# Altium footprint library XC Driver Board.PcbLib: 29 footprints (part 1 of 2)
Each footprint in its own frame and in the unit in brackets; x right, y up, seen from the top. Pads: shape width x height; smd on the part's side, far side on the other; paste and mask are expansions set on the pad; w line width, h text height; cw(c..) or ccw(c..) is an arc to the next point about the centre after c.
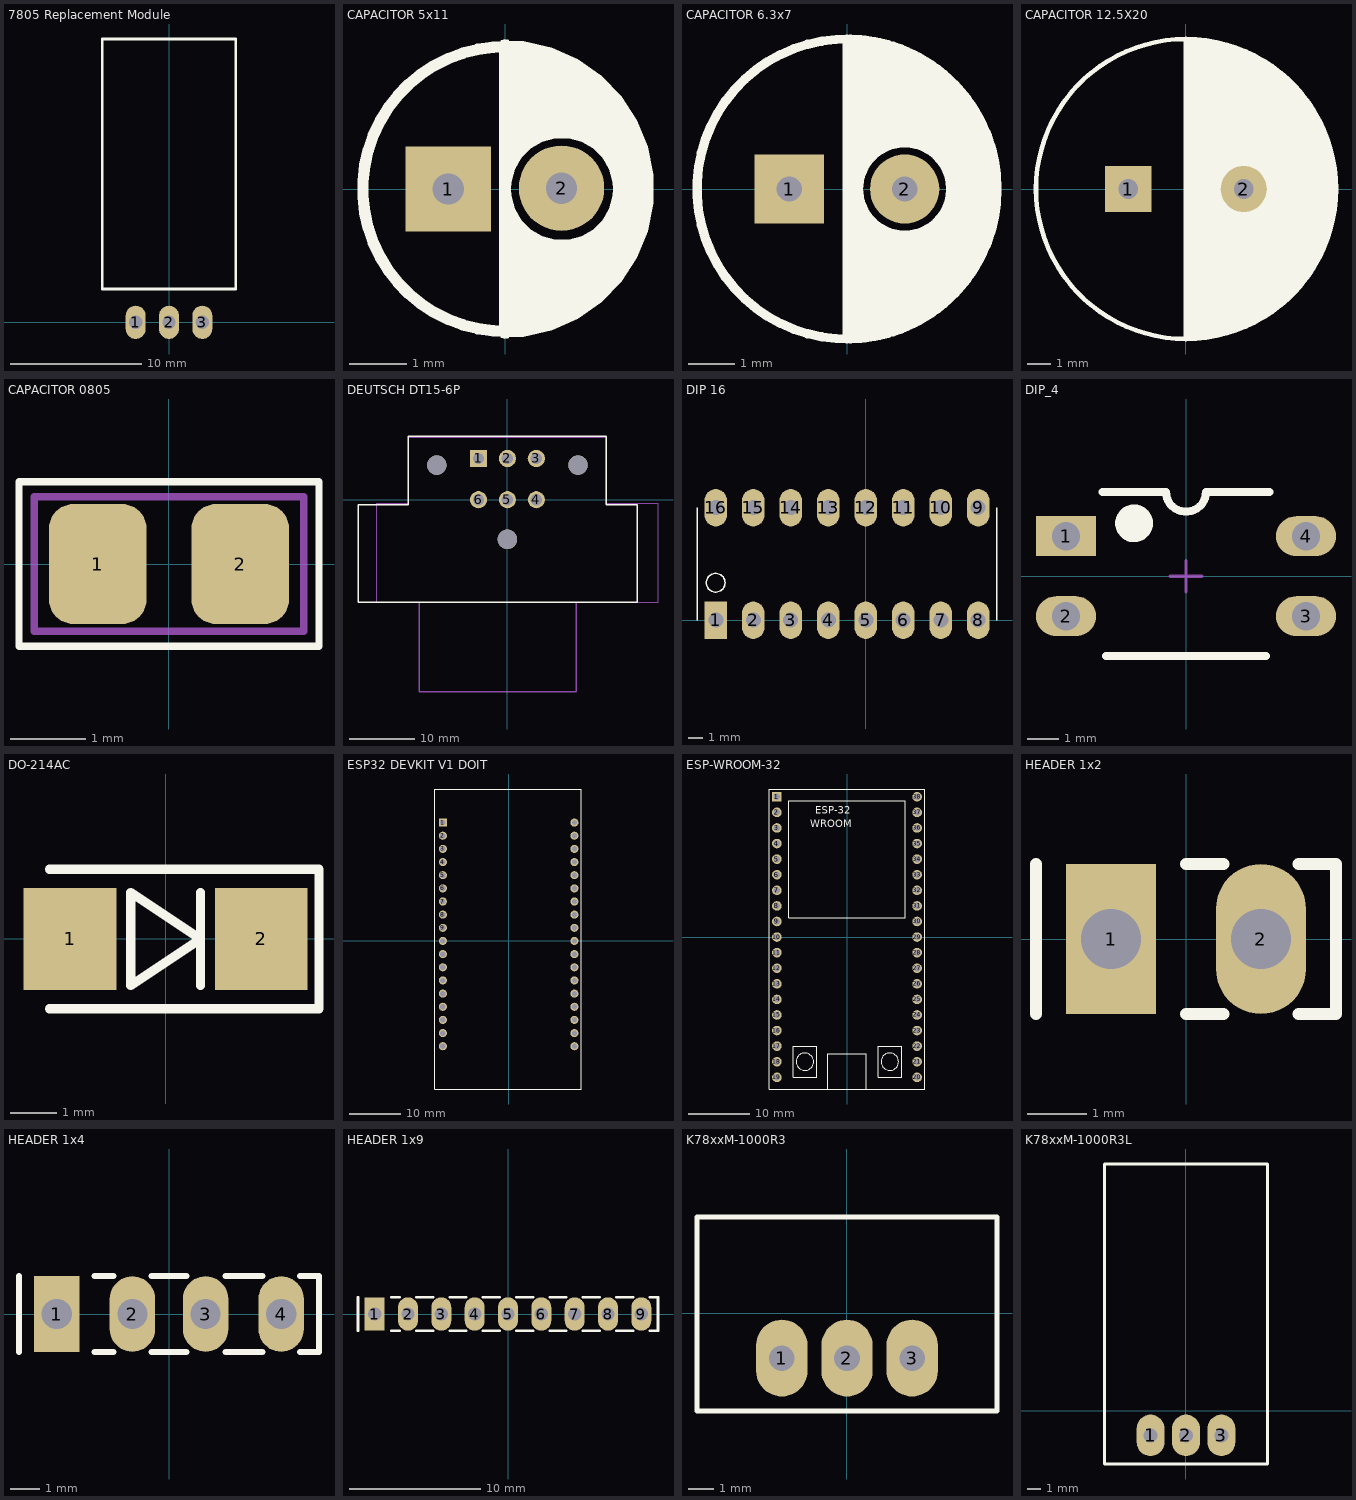
[diagram p0: the footprints below, top view; thin cyan lines are the x and y axes]

## 7805 Replacement Module [mil]
pads (3):
  oval 60x100 hole 40: 1(-100,0) 2(0,0) 3(100,0)
Top Overlay:
  lines w7.87: -200,100 200,100 200,850 -200,850 -200,100
3D body "DD4012SA 6.5-40V to 3.3V 5V DC-DC Step-Down Buck Converter, 1A.STEP": height 291.84, standoff 0.5, extent -204.72,-90.55 204.73,854.33

## CAPACITOR 5x11 [mm] "CAPACITOR ALUMINIUM ELECTROLYTIC D=5MM H=11"
pads (2):
  rect 1.5x1.5 hole 0.55: 1(-1,0)
  round 1.5 hole 0.55: 2(0.99,0.015)
Top Overlay:
  circle w0.2: c0,0 r2.5
  region: -0.1,0 -0.1,2.53 -0.1,2.561 -0.066,2.612 -0.009,2.635 0.051,2.622 0.072,2.599 0.324,2.592 0.815,2.482 1.275,2.28 1.689,1.993 2.04,1.633 2.315,1.211 2.504,0.745 2.6,0.252 2.6,0 2.6,-0.02 2.585,-0.057 2.557,-0.085 2.52,-0.1 2.5,-0.1 2,-0.1 1.98,-0.1 1.943,-0.085 1.915,-0.057 1.9,-0.02 1.9,0 1.892,0.117 1.831,0.344 1.714,0.548 1.548,0.714 1.344,0.831 1.117,0.892 0.883,0.892 0.656,0.831 0.452,0.714 0.286,0.548 0.169,0.344 0.108,0.117 0.1,0 0.1,-0.042 0.042,-0.1 -0.042,-0.1 -0.1,-0.042
  region: -0.1,0 -0.1,-2.53 -0.1,-2.561 -0.066,-2.612 -0.009,-2.635 0.051,-2.622 0.072,-2.599 0.324,-2.592 0.815,-2.482 1.275,-2.28 1.689,-1.993 2.04,-1.633 2.315,-1.211 2.504,-0.745 2.6,-0.252 2.6,0 2.6,0.02 2.585,0.057 2.557,0.085 2.52,0.1 2.5,0.1 2,0.1 1.98,0.1 1.943,0.085 1.915,0.057 1.9,0.02 1.9,0 1.892,-0.117 1.831,-0.344 1.714,-0.548 1.548,-0.714 1.344,-0.831 1.117,-0.892 0.883,-0.892 0.656,-0.831 0.452,-0.714 0.286,-0.548 0.169,-0.344 0.108,-0.117 0.1,0 0.1,0.042 0.042,0.1 -0.042,0.1 -0.1,0.042
  lines w0.2: 0,-2.5 ccw(c0,0) 2.5,0 ; 0,2.5 cw(c0,0) 2.5,0 ; 0,2.53 0,0 ; 0,0 cw(c1,0) 2,0 ; 0,0 ccw(c1,0) 2,0 ; 2,0 2.5,0 ; 2,0 2.5,0
3D body "Capacitor_Electrolytic_5mm.stp": height 8.3, standoff -2.4, extent -2.5,-2.5 2.53,2.53

## CAPACITOR 6.3x7 [mm] "CAPACITOR ALUMINIUM ELECTROLYTIC D=6.3MM H=7MM"
pads (2):
  rect 1.5x1.5 hole 0.55: 1(-1.25,0)
  round 1.5 hole 0.55: 2(1.25,0)
Top Overlay:
  circle w0.2: c0,0 r3.25
  region: 0,0 0,3.25 0.213,3.25 0.635,3.194 1.047,3.084 1.441,2.921 1.809,2.708 2.147,2.449 2.449,2.147 2.708,1.809 2.921,1.441 3.084,1.047 3.194,0.635 3.25,0.213 3.25,0 2.25,0 2.241,0.131 2.174,0.383 2.043,0.609 1.859,0.793 1.633,0.924 1.381,0.991 1.119,0.991 0.867,0.924 0.641,0.793 0.457,0.609 0.326,0.383 0.259,0.131 0.25,0
  region: 0,0 0,-3.25 0.213,-3.25 0.635,-3.194 1.047,-3.084 1.441,-2.921 1.809,-2.708 2.147,-2.449 2.449,-2.147 2.708,-1.809 2.921,-1.441 3.084,-1.047 3.194,-0.635 3.25,-0.213 3.25,0 2.25,0 2.241,-0.131 2.174,-0.383 2.043,-0.609 1.859,-0.793 1.633,-0.924 1.381,-0.991 1.119,-0.991 0.867,-0.924 0.641,-0.793 0.457,-0.609 0.326,-0.383 0.259,-0.131 0.25,0
  lines w0.2: 0,0 0.25,0 ; 0,0 0,3.25 cw(c0,0) 3.25,0 ; 0,0 0,-3.25 ccw(c0,0) 3.25,0 ; 0,0 0.25,0 ; 0.25,0 cw(c1.25,0) 2.25,0 ; 0.25,0 ccw(c1.25,0) 2.25,0 ; 2.25,0 3.25,0 ; 2.25,0 3.25,0
3D body "Aluminum_electrolytic_capacitor_radial_D6.3_H7_PinD0.5_Pitch2.5_nominal_black.step": height 7, standoff -3, extent -3.15,-3.15 3.15,3.15

## CAPACITOR 12.5X20 [mm] "CAPACITOR ALUMINIUM ELECTROLYTIC D=12.5MM H=20MM"
pads (2):
  rect 2x2 hole 0.85: 1(-2.5,0)
  round 2 hole 0.85: 2(2.5,0)
Top Overlay:
  circle w0.2: c0,0 r6.5
  circle w0.2: c2.5,0 r1.25
  pour cut-out: 1.25,0 1.25,-0.123 1.298,-0.365 1.392,-0.592 1.529,-0.797 1.703,-0.971 1.908,-1.108 2.135,-1.202 2.377,-1.25 2.5,-1.25 2.623,-1.25 2.865,-1.202 3.092,-1.108 3.297,-0.971 3.471,-0.797 3.608,-0.592 3.702,-0.365 3.75,-0.123 3.75,0 3.75,0.123 3.702,0.365 3.608,0.592 3.471,0.797 3.297,0.971 3.092,1.108 2.865,1.202 2.623,1.25 2.5,1.25 2.377,1.25 2.135,1.202 1.908,1.108 1.703,0.971 1.529,0.797 1.392,0.592 1.298,0.365 1.25,0.123
  region: 1.091,6.418 1.802,6.256 2.491,6.015 3.149,5.698 3.767,5.309 4.338,4.854 4.854,4.338 5.309,3.767 5.698,3.149 6.015,2.491 6.256,1.802 6.418,1.091 6.5,0.365 6.5,-0.365 6.418,-1.091 6.256,-1.802 6.015,-2.491 5.698,-3.149 5.309,-3.767 4.854,-4.338 4.338,-4.854 3.767,-5.309 3.149,-5.698 2.491,-6.015 1.802,-6.256 1.091,-6.418 0.365,-6.5 0,-6.5 0,6.5 0.365,6.5 hole: 2.623,1.25 2.377,1.25 2.135,1.202 1.908,1.108 1.703,0.971 1.529,0.797 1.392,0.592 1.298,0.365 1.25,0.123 1.25,0 1.25,-0.123 1.298,-0.365 1.392,-0.592 1.529,-0.797 1.703,-0.971 1.908,-1.108 2.135,-1.202 2.377,-1.25 2.623,-1.25 2.865,-1.202 3.092,-1.108 3.297,-0.971 3.471,-0.797 3.608,-0.592 3.702,-0.365 3.75,-0.123 3.75,0 3.75,0.123 3.702,0.365 3.608,0.592 3.471,0.797 3.297,0.971 3.092,1.108 2.865,1.202
  lines w0.2: 0,-6.5 ccw(c0,0) 0,6.5 0,-6.5
3D body "User Library-CapAluRadial_D125H200.STEP": height 22, standoff -3, extent -6.5,-6.5 6.5,6.5

## CAPACITOR 0805 [mm]
height 1.7
pads (2):
  rrect50% 1.3x1.6 smd: 1(-0.95,0) 2(0.95,0)
Top Overlay:
  lines w0.1: -2,-1.1 2,-1.1 2,1.1 -2,1.1 -2,-1.1
Mechanical 15:
  lines w0.1: -1.8,-0.9 -1.8,0.9 1.8,0.9 1.8,-0.9 -1.8,-0.9
3D body "User Library-0805(2012M) Cap.step": height 0.8, standoff 0.01, extent -1.254,-0.622 1.254,0.622

## DEUTSCH DT15-6P [mm]
pads (9):
  rect 2.64x2.64 hole 1.76: 1(-4.45,6.35)
  round 2.64 hole 1.76: 2(0,6.35) 3(4.45,6.35) 4(4.45,0) 5(0,0) 6(-4.45,0)
  round 2.99 hole 2.99 unplated: ""(-10.87,5.33) ""(0,-6.1) ""(10.87,5.33)
Top Overlay:
  lines w0.2: -20,-15.75 0,-15.75 20,-15.75 20,-14.75 ; -20,-0.8 -15.25,-0.8 ; -17.25,-15.75 -23,-15.75 -23,-0.8 -15.25,-0.8 ; 20,-15.5 20,-0.8 15.25,-0.8 15.25,9.75 0,9.75 -15.25,9.75 -15.25,-0.8
Mechanical 3:
  lines w0.2: -13.566,-15.75 -13.566,-29.536 10.59,-29.536 10.59,-15.75
Mechanical 15:
  lines w0.05: -20.12,-15.75 -20.12,-0.55 -15.185,-0.55 -15.185,9.64 15.185,9.64 15.185,-0.55 23.18,-0.55 23.18,-15.75 -20.12,-15.75
3D body "DT13-6P.step": height 35.49, standoff -3.22, extent -22.887,-30.095 19.912,9.525

## DIP 16 [mil]
pads (16):
  rect 60x100 hole 40: 1(-400,0)
  oval 60x100 hole 40: 2(-300,0) 3(-200,0) 4(-100,0) 5(0,0) 6(100,0) 7(200,0) 8(300,0) 9(300,300) 10(200,300) 11(100,300) 12(0,300) 13(-100,300) 14(-200,300) 15(-300,300) 16(-400,300)
Top Overlay:
  circle w3.94: c-400,100 r25
  lines w3.94: -450,0 -450,300 ; 350,0 350,300
3D body "DIP16.STEP": height 185.04, standoff -102.36, extent -442.91,-4.92 342.91,304.92

## DIP_4 [mm]
pads (4):
  rect 1.905x1.27 hole 0.9: 1(-3.81,1.27)
  oval 1.905x1.27 hole 0.9: 2(-3.81,-1.27) 3(3.81,-1.27) 4(3.81,1.27)
Top Overlay:
  circle w0.6: c-1.65,1.68 r0.3
  lines w0.254: -2.65,2.68 -0.635,2.68 ccw(c0,2.68) 0.635,2.68 2.65,2.68 ; -2.54,-2.54 2.54,-2.54
Mechanical 15:
  lines w0.1: -0.5,0 0.5,0 ; 0,-0.5 0,0.5
3D body "CircuitWorks-DIP4.step": height 4.31, standoff -3.28, extent -4,-2.92 4,2.62

## DO-214AC [mm]
pads (2):
  rect 2x2.2 smd: 1(-2.057,0) 2(2.057,0)
Top Overlay:
  lines w0.2: -2.5,-1.5 3.3,-1.5 3.3,1.5 -2.5,1.5 ; 0.75,-1 0.75,1 ; -0.75,-1 0.75,0 -0.75,1 -0.75,-1
3D body "DO-214AC-DIOM5127X23N.stp": height 2.3, standoff 0, extent -2.65,-1.4 2.65,1.4

## ESP32 DEVKIT V1 DOIT [mm] "ESP32 DEVKIT V1 DOIT"
pads (36):
  rect 1.56x1.56 hole 1.04: 1(-12.7,22.86)
  round 1.56 hole 1.04: 2(-12.7,20.32) 3(-12.7,17.78) 4(-12.7,15.24) 5(-12.7,12.7) 6(-12.7,10.16) 7(-12.7,7.62) 8(-12.7,5.08) 9(-12.7,2.54) 10(-12.7,0) 11(-12.7,-2.54) 12(-12.7,-5.08) 13(-12.7,-7.62) 14(-12.7,-10.16) 15(-12.7,-12.7) 16(-12.7,-15.24) 17(-12.7,-17.78) 18(-12.7,-20.32) 19(12.7,-20.32) 20(12.7,-17.78) 21(12.7,-15.24) 22(12.7,-12.7) 23(12.7,-10.16) 24(12.7,-7.62) 25(12.7,-5.08) 26(12.7,-2.54) 27(12.7,0) 28(12.7,2.54) 29(12.7,5.08) 30(12.7,7.62) 31(12.7,10.16) 32(12.7,12.7) 33(12.7,15.24) 34(12.7,17.78) 35(12.7,20.32) 36(12.7,22.86)
Top Overlay:
  lines w0.2: -14.224,-28.575 13.97,-28.575 13.97,29.337 -14.224,29.337 -14.224,-28.575
3D body "Pin Header 1x9 TH Pitch 2.54mm.stp": height 5.74, standoff -6.96, extent 11.43,-21.59 13.97,1.27
3D body "Pin Header 1x9 TH Pitch 2.54mm.stp": height 5.74, standoff -6.96, extent 11.43,1.27 13.97,24.13
3D body "Pin Header 1x9 TH Pitch 2.54mm.stp": height 5.74, standoff -6.96, extent -13.97,-21.59 -11.43,1.27
3D body "Pin Header 1x9 TH Pitch 2.54mm.stp": height 5.74, standoff -6.96, extent -13.97,1.27 -11.43,24.13
3D body "ESP32 Board.step": height 7.01, standoff 2.54, extent -14.224,-28.584 13.819,29.345

## ESP-WROOM-32 [mm] "ESP-WROOM-32 38 PIN Develeopment Board PINOUT"
pads (38):
  rect 1.56x1.56 hole 1.04: 1(-11.43,22.86)
  round 1.56 hole 1.04: 2(-11.43,20.32) 3(-11.43,17.78) 4(-11.43,15.24) 5(-11.43,12.7) 6(-11.43,10.16) 7(-11.43,7.62) 8(-11.43,5.08) 9(-11.43,2.54) 10(-11.43,0) 11(-11.43,-2.54) 12(-11.43,-5.08) 13(-11.43,-7.62) 14(-11.43,-10.16) 15(-11.43,-12.7) 16(-11.43,-15.24) 17(-11.43,-17.78) 18(-11.43,-20.32) 19(-11.43,-22.86) 20(11.43,-22.86) 21(11.43,-20.32) 22(11.43,-17.78) 23(11.43,-15.24) 24(11.43,-12.7) 25(11.43,-10.16) 26(11.43,-7.62) 27(11.43,-5.08) 28(11.43,-2.54) 29(11.43,0) 30(11.43,2.54) 31(11.43,5.08) 32(11.43,7.62) 33(11.43,10.16) 34(11.43,12.7) 35(11.43,15.24) 36(11.43,17.78) 37(11.43,20.32) 38(11.43,22.86)
Top Overlay:
  circle w0.1: c-6.858,-20.32 r1.42
  circle w0.1: c6.985,-20.32 r1.42
  lines w0.2: 0,-24.765 -3.175,-24.765 -3.175,-19.05 3.175,-19.05 3.175,-24.765 ; -12.7,-24.765 -12.7,24.13 12.7,24.13 12.7,-24.765 -12.7,-24.765 ; -9.525,3.175 9.525,3.175 9.525,22.225 0,22.225 -9.525,22.225 -9.525,3.175 ; -8.763,-22.86 -8.763,-17.78 -4.953,-17.78 -4.953,-22.86 -8.763,-22.86 ; 5.08,-22.86 8.89,-22.86 8.89,-17.78 5.08,-17.78 5.08,-22.86
  text "WROOM" at -5.969,17.526 h2
  text "ESP-32" at -5.207,19.685 h2
3D body "ESP32Wroom32s.STEP": height 6.81, standoff -6.19, extent -12.68,-24.847 12.72,24.199

## HEADER 1x2 [mil]
pads (2):
  rect 60x100 hole 40: 1(-50,0)
  oval 60x100 hole 40: 2(50,0)
Top Overlay:
  lines w7.87: -100,-50 -100,50 ; 0,-50 25,-50 ; 0,50 25,50 ; 75,-50 100,-50 100,50 75,50
3D body "Pin Header 1x2 TH Pitch 2.54mm.stp": height 373.85, standoff -125.98, extent -100,-50 100,50

## HEADER 1x4 [mil]
pads (4):
  rect 60x100 hole 40: 1(-148.43,0)
  oval 60x100 hole 40: 2(-48.43,0) 3(48.43,0) 4(148.43,0)
Top Overlay:
  lines w7.87: -198.43,-50 -198.43,50 ; -98.43,-50 -73.43,-50 ; -98.43,50 -73.43,50 ; -23.43,-50 1.57,-50 ; -23.43,50 1.57,50 ; -1.57,-50 23.43,-50 ; -1.57,50 23.43,50 ; 75,-50 100,-50 ; 75,50 100,50 ; 98.43,-50 123.43,-50 ; 98.43,50 123.43,50 ; 173.43,-50 198.43,-50 198.43,50 173.43,50
3D body "Pin Header 1x2 TH Pitch 2.54mm.stp": height 373.85, standoff -125.98, extent -198.42,-50 1.58,50
3D body "Pin Header 1x2 TH Pitch 2.54mm.stp": height 373.85, standoff -125.98, extent -1.57,-50 198.43,50

## HEADER 1x9 [mil]
pads (9):
  rect 60x100 hole 40: 1(-400,0)
  oval 60x100 hole 40: 2(-300,0) 3(-200,0) 4(-100,0) 5(0,0) 6(100,0) 7(200,0) 8(300,0) 9(400,0)
Top Overlay:
  lines w7.87: -450,-50 -450,50 ; -350,-50 -325,-50 ; -350,50 -325,50 ; -275,-50 -225,-50 ; -275,50 -225,50 ; -175,-50 -125,-50 ; -175,50 -125,50 ; -75,-50 -25,-50 ; -75,50 -25,50 ; 25,-50 75,-50 ; 25,50 75,50 ; 125,-50 175,-50 ; 125,50 175,50 ; 225,-50 275,-50 ; 225,50 275,50 ; 325,-50 375,-50 ; 325,50 375,50 ; 425,-50 450,-50 450,50 425,50

## K78xxM-1000R3 [mm]
pads (3):
  oval 2x3 hole 1: 1(-2.54,-1.75) 2(0,-1.75) 3(2.54,-1.75)
Top Overlay:
  lines w0.2: -5.85,-3.81 -5.85,3.75 5.85,3.75 5.85,-3.81 -5.85,-3.81
3D body "TSR 1-2450.stp": height 10.11, standoff -4.09, extent -5.85,-3.8 5.85,3.75

## K78xxM-1000R3L [mm]
pads (3):
  oval 2x3 hole 1: 1(-2.54,-1.75) 2(0,-1.75) 3(2.54,-1.75)
Top Overlay:
  lines w0.2: -5.85,-3.81 5.85,-3.81 5.85,3.75 5.85,17.75 -5.85,17.75 -5.85,3.75 -5.85,-3.81
3D body "CUI_P7805-2000-S.step": height 9.05, standoff -0.14, extent -5.75,-4.1 5.75,17.578